# Altium footprint library con-molex.PCBLIB: 368 footprints (part 25 of 26)
Each footprint in its own frame and in the unit in brackets; x right, y up, seen from the top. Pads: shape width x height; smd on the part's side, far side on the other; paste and mask are expansions set on the pad; w line width, h text height; cw(c..) or ccw(c..) is an arc to the next point about the centre after c.
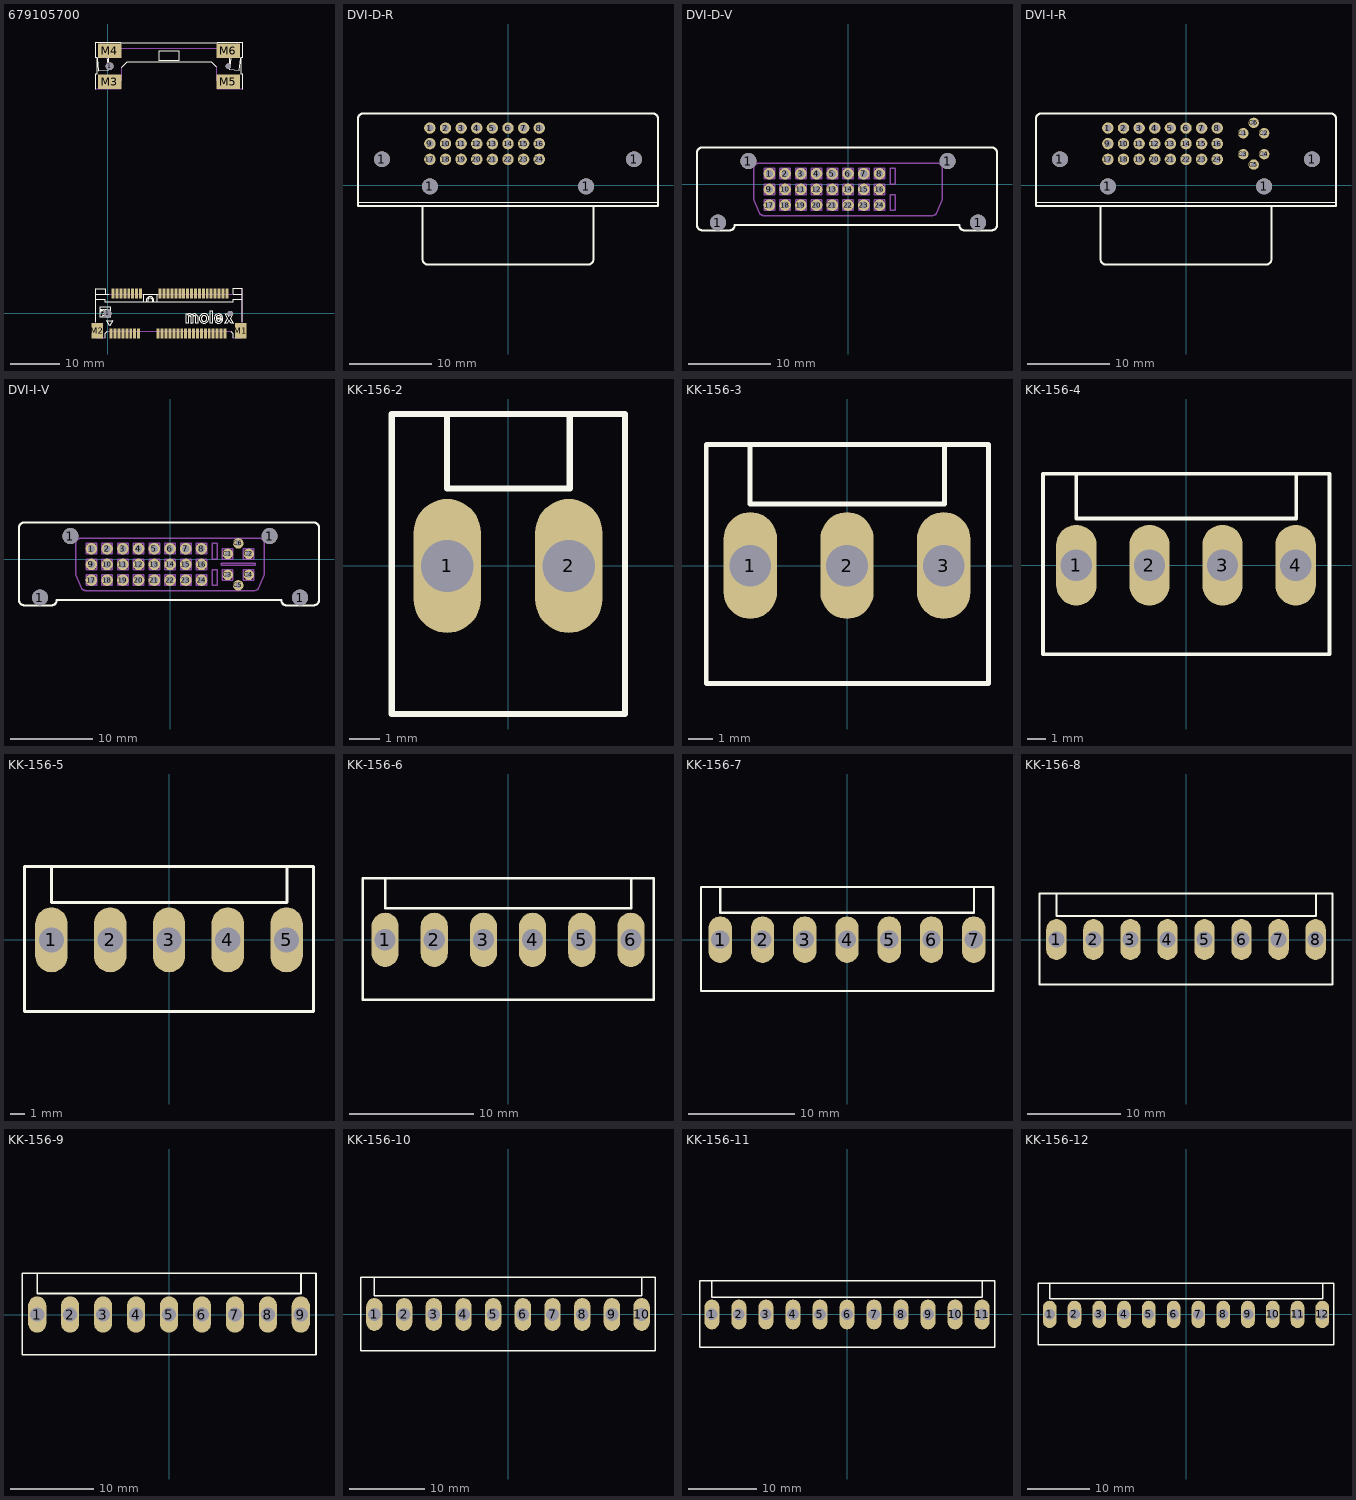
[diagram p24: the footprints below, top view; thin cyan lines are the x and y axes]

## 679105700 [mm]
pads (62):
  round 1.6 hole 1.6: 1(0,0) 1(0.4,50.4)
  rect 0.6x2 smd: 1(0.7,-4.1) 2(1.1,4.1) 3(1.5,-4.1) 4(1.9,4.1) 5(2.3,-4.1) 6(2.7,4.1) 7(3.1,-4.1) 8(3.5,4.1) 9(3.9,-4.1) 10(4.3,4.1) 11(4.7,-4.1) 12(5.1,4.1) 13(5.5,-4.1) 14(5.9,4.1) 15(6.3,-4.1) 16(6.7,4.1) 17(10.3,-4.1) 18(10.7,4.1) 19(11.1,-4.1) 20(11.5,4.1) 21(11.9,-4.1) 22(12.3,4.1) 23(12.7,-4.1) 24(13.1,4.1) 25(13.5,-4.1) 26(13.9,4.1) 27(14.3,-4.1) 28(14.7,4.1) 29(15.1,-4.1) 30(15.5,4.1) 31(15.9,-4.1) 32(16.3,4.1) 33(16.7,-4.1) 34(17.1,4.1) 35(17.5,-4.1) 36(17.9,4.1) 37(18.3,-4.1) 38(18.7,4.1) 39(19.1,-4.1) 40(19.5,4.1) 41(19.9,-4.1) 42(20.3,4.1) 43(20.7,-4.1) 44(21.1,4.1) 45(21.5,-4.1) 46(21.9,4.1) 47(22.3,-4.1) 48(22.7,4.1) 49(23.1,-4.1) 50(23.5,4.1) 51(23.9,-4.1) 52(24.3,4.1)
  round 1.1 hole 1.1: 1(24.6,50.4) 1(25,0)
  rect 2.3x3.2 smd: M1(27.15,-3.5) M2(-2.15,-3.5)
  rect 4.8x3 smd: M3(0.4,47.25) M4(0.4,53.55) M5(24.6,47.25) M6(24.6,53.55)
Top Overlay:
  drawing of 161 lines, arcs and shapes, not listed
Top Paste:
  rectangle: 0.437,-5.05 0.962,-3.15
  rectangle: 1.237,-5.05 1.763,-3.15
  rectangle: 2.038,-5.05 2.563,-3.15
  rectangle: 2.837,-5.05 3.362,-3.15
  rectangle: 3.638,-5.05 4.163,-3.15
  rectangle: 4.437,-5.05 4.962,-3.15
  rectangle: 5.237,-5.05 5.762,-3.15
  rectangle: 6.038,-5.05 6.563,-3.15
  rectangle: 10.038,-5.05 10.563,-3.15
  rectangle: 10.837,-5.05 11.362,-3.15
  rectangle: 11.638,-5.05 12.163,-3.15
  rectangle: 12.438,-5.05 12.962,-3.15
  rectangle: 13.237,-5.05 13.762,-3.15
  rectangle: 14.038,-5.05 14.563,-3.15
  rectangle: 14.837,-5.05 15.362,-3.15
  rectangle: 15.638,-5.05 16.163,-3.15
  rectangle: 16.438,-5.05 16.963,-3.15
  rectangle: 17.237,-5.05 17.762,-3.15
  rectangle: 18.038,-5.05 18.563,-3.15
  rectangle: 18.837,-5.05 19.362,-3.15
  rectangle: 19.638,-5.05 20.163,-3.15
  rectangle: 20.438,-5.05 20.963,-3.15
  rectangle: 21.237,-5.05 21.762,-3.15
  rectangle: 22.038,-5.05 22.563,-3.15
  rectangle: 22.837,-5.05 23.362,-3.15
  rectangle: 23.637,-5.05 24.163,-3.15
  rectangle: 26.1,-5 28.2,-2
  rectangle: -3.2,-4.988 -1.1,-1.988
  rectangle: 0.837,3.15 1.362,5.05
  rectangle: 1.638,3.15 2.163,5.05
  rectangle: 2.437,3.15 2.962,5.05
  rectangle: 3.237,3.15 3.763,5.05
  rectangle: 4.038,3.15 4.563,5.05
  rectangle: 4.837,3.15 5.362,5.05
  rectangle: 5.638,3.15 6.163,5.05
  rectangle: 6.437,3.15 6.962,5.05
  rectangle: 10.438,3.15 10.962,5.05
  rectangle: 11.237,3.15 11.762,5.05
  rectangle: 12.038,3.15 12.563,5.05
  rectangle: 12.837,3.15 13.362,5.05
  rectangle: 13.638,3.15 14.163,5.05
  rectangle: 14.438,3.15 14.962,5.05
  rectangle: 15.237,3.15 15.762,5.05
  rectangle: 16.038,3.15 16.563,5.05
  rectangle: 16.837,3.15 17.362,5.05
  rectangle: 17.638,3.15 18.163,5.05
  rectangle: 18.438,3.15 18.963,5.05
  rectangle: 19.237,3.15 19.762,5.05
  rectangle: 20.038,3.15 20.563,5.05
  rectangle: 20.837,3.15 21.362,5.05
  rectangle: 21.637,3.15 22.163,5.05
  rectangle: 22.438,3.15 22.963,5.05
  rectangle: 23.237,3.15 23.762,5.05
  rectangle: 24.038,3.15 24.563,5.05
  rectangle: -1.863,52.237 2.638,54.888
  rectangle: -1.863,45.925 2.638,48.575
  rectangle: 22.35,52.2 26.85,54.888
  rectangle: 22.338,45.937 26.837,48.587
Top Solder:
  rectangle: 0.35,-5.175 1.038,-3.025
  rectangle: 1.15,-5.175 1.837,-3.025
  rectangle: 1.95,-5.175 2.638,-3.025
  rectangle: 2.75,-5.175 3.437,-3.025
  rectangle: 3.55,-5.175 4.237,-3.025
  rectangle: 4.35,-5.175 5.038,-3.025
  rectangle: 5.15,-5.175 5.837,-3.025
  rectangle: 5.95,-5.175 6.638,-3.025
  rectangle: 9.95,-5.175 10.638,-3.025
  rectangle: 10.75,-5.175 11.438,-3.025
  rectangle: 11.55,-5.175 12.237,-3.025
  rectangle: 12.35,-5.175 13.038,-3.025
  rectangle: 13.15,-5.175 13.837,-3.025
  rectangle: 13.95,-5.175 14.638,-3.025
  rectangle: 14.75,-5.175 15.438,-3.025
  rectangle: 15.55,-5.175 16.237,-3.025
  rectangle: 16.35,-5.175 17.038,-3.025
  rectangle: 17.15,-5.175 17.837,-3.025
  rectangle: 17.95,-5.175 18.638,-3.025
  rectangle: 18.75,-5.175 19.438,-3.025
  rectangle: 19.55,-5.175 20.237,-3.025
  rectangle: 20.35,-5.175 21.038,-3.025
  rectangle: 21.15,-5.175 21.837,-3.025
  rectangle: 21.95,-5.175 22.637,-3.025
  rectangle: 22.75,-5.175 23.438,-3.025
  rectangle: 23.55,-5.175 24.237,-3.025
  rectangle: 25.9,-5.2 28.4,-1.813
  rectangle: -3.4,-5.187 -0.9,-1.8
  rectangle: 0.75,3.025 1.437,5.175
  rectangle: 1.55,3.025 2.237,5.175
  rectangle: 2.35,3.025 3.038,5.175
  rectangle: 3.15,3.025 3.837,5.175
  rectangle: 3.95,3.025 4.638,5.175
  rectangle: 4.75,3.025 5.437,5.175
  rectangle: 5.55,3.025 6.237,5.175
  rectangle: 6.35,3.025 7.038,5.175
  rectangle: 10.35,3.025 11.038,5.175
  rectangle: 11.15,3.025 11.837,5.175
  rectangle: 11.95,3.025 12.638,5.175
  rectangle: 12.75,3.025 13.438,5.175
  rectangle: 13.55,3.025 14.237,5.175
  rectangle: 14.35,3.025 15.038,5.175
  rectangle: 15.15,3.025 15.837,5.175
  rectangle: 15.95,3.025 16.638,5.175
  rectangle: 16.75,3.025 17.438,5.175
  rectangle: 17.55,3.025 18.237,5.175
  rectangle: 18.35,3.025 19.038,5.175
  rectangle: 19.15,3.025 19.837,5.175
  rectangle: 19.95,3.025 20.637,5.175
  rectangle: 20.75,3.025 21.438,5.175
  rectangle: 21.55,3.025 22.237,5.175
  rectangle: 22.35,3.025 23.038,5.175
  rectangle: 23.15,3.025 23.837,5.175
  rectangle: 23.95,3.025 24.637,5.175
  rectangle: -2.187,51.875 2.962,55.212
  rectangle: -2.187,45.563 2.962,48.9
  rectangle: 22.025,51.875 27.175,55.212
  rectangle: 22.012,45.575 27.163,48.913
Mechanical 16:
  rectangle: 0.948,3.929 1.274,4.77
  rectangle: 1.761,3.929 2.087,4.77
  rectangle: 2.547,3.929 2.872,4.77
  rectangle: 3.333,3.929 3.659,4.77
  rectangle: 10.54,3.929 10.865,4.77
  rectangle: 11.353,3.929 11.678,4.77
  rectangle: 12.139,3.929 12.464,4.77
  rectangle: 0.571,-4.553 0.842,-3.604
  rectangle: 1.357,-4.553 1.628,-3.605
  rectangle: 2.17,-4.553 2.441,-3.605
  rectangle: 10.163,-4.553 10.434,-3.605
  rectangle: 10.976,-4.553 11.247,-3.605
  rectangle: 11.788,-4.553 12.059,-3.605
  rectangle: 2.97,-4.553 3.241,-3.605
  rectangle: 3.77,-4.553 4.041,-3.605
  rectangle: 4.57,-4.553 4.841,-3.605
  rectangle: 5.37,-4.553 5.641,-3.605
  rectangle: 6.17,-4.553 6.441,-3.605
  rectangle: 12.563,-4.553 12.834,-3.605
  rectangle: 13.362,-4.553 13.633,-3.605
  rectangle: 14.163,-4.553 14.434,-3.605
  rectangle: 14.962,-4.553 15.233,-3.605
  rectangle: 15.762,-4.553 16.033,-3.605
  rectangle: 16.563,-4.553 16.834,-3.605
  rectangle: 17.362,-4.553 17.633,-3.605
  rectangle: 18.163,-4.553 18.434,-3.605
  rectangle: 18.963,-4.553 19.233,-3.605
  rectangle: 19.762,-4.553 20.033,-3.605
  rectangle: 20.563,-4.553 20.834,-3.605
  rectangle: 21.362,-4.553 21.633,-3.605
  rectangle: 22.163,-4.553 22.434,-3.605
  rectangle: 22.963,-4.553 23.233,-3.605
  rectangle: 23.762,-4.553 24.033,-3.605
  rectangle: 4.149,3.929 4.474,4.77
  rectangle: 4.948,3.929 5.274,4.77
  rectangle: 5.749,3.929 6.074,4.77
  rectangle: 6.549,3.929 6.874,4.77
  rectangle: 12.94,3.929 13.265,4.77
  rectangle: 13.74,3.929 14.065,4.77
  rectangle: 14.54,3.929 14.865,4.77
  rectangle: 15.34,3.929 15.665,4.77
  rectangle: 16.14,3.929 16.465,4.77
  rectangle: 16.94,3.929 17.265,4.77
  rectangle: 17.74,3.929 18.065,4.77
  rectangle: 18.54,3.929 18.865,4.77
  rectangle: 19.34,3.929 19.665,4.77
  rectangle: 20.14,3.929 20.465,4.77
  rectangle: 20.94,3.929 21.265,4.77
  rectangle: 21.74,3.929 22.065,4.77
  rectangle: 22.54,3.929 22.865,4.77
  rectangle: 23.34,3.929 23.665,4.77
  rectangle: 24.14,3.929 24.465,4.77
  lines w0.102: -2.439,5.068 -2.439,-4.905 -0.542,-4.905 ; -2.43,45.685 2.563,45.685 2.563,47.408 2.739,47.408 2.739,50.059 ; -2.385,3.929 27.371,3.929 ; -2.077,52.003 -0.044,52.18 0.177,49.706 0.177,53.992 ; -1.37,55.229 -1.37,54.389 ccw(c-1.016,54.389) -1.016,54.036 25.847,54.036 ccw(c25.847,54.566) 26.377,54.566 26.377,55.273 ; -0.081,-3.577 25.04,-3.577 ; 22.224,50.192 22.224,47.408 22.401,47.408 22.401,45.685 27.438,45.685 ; 24.787,53.992 24.787,49.794 25.096,52.18 27.084,52.003 ; 25.528,-4.932 27.425,-4.932 27.425,5.068

## DVI-D-R [mil]
pads (28):
  round 76 hole 76: 1(-605,125) 1(-375,-5) 1(375,-5) 1(605,125)
  round 55 hole 34: 1(-375,275) 2(-300,275) 3(-225,275) 4(-150,275) 5(-75,275) 6(0,275) 7(75,275) 8(150,275) 9(-375,200) 10(-300,200) 11(-225,200) 12(-150,200) 13(-75,200) 14(0,200) 15(75,200) 16(150,200) 17(-375,125) 18(-300,125) 19(-225,125) 20(-150,125) 21(-75,125) 22(0,125) 23(75,125) 24(150,125)
Top Overlay:
  lines w2: -720,-81 720,-81
  lines w10: -410,-105 -410,-355 ccw(c-385,-355) -385,-380 385,-380 ccw(c385,-355) 410,-355 410,-105 ; -720,-100 -720,-81 -720,320 cw(c-695,320) -695,345 695,345 cw(c695,320) 720,320 720,-81 720,-100 -720,-100

## DVI-D-V [mil]
pads (28):
  round 76 hole 76: 1(-620,-183) 1(-475,110) 1(475,110) 1(620,-183)
  round 55 hole 34: 1(-375,50) 2(-300,50) 3(-225,50) 4(-150,50) 5(-75,50) 6(0,50) 7(75,50) 8(150,50) 9(-375,-25) 10(-300,-25) 11(-225,-25) 12(-150,-25) 13(-75,-25) 14(0,-25) 15(75,-25) 16(150,-25) 17(-375,-100) 18(-300,-100) 19(-225,-100) 20(-150,-100) 21(-75,-100) 22(0,-100) 23(75,-100) 24(150,-100)
Top Overlay:
  lines w10: -720,-195 -720,150 cw(c-695,150) -695,175 685,175 cw(c685,150) 710,150 710,-195 cw(c685,-195) 685,-220 555,-220 cw(c555,-195) 530,-195 -540,-195 cw(c-565,-195) -565,-220 -695,-220 cw(c-695,-195) -720,-195
Mechanical 16:
  lines w6: -450,-75 -450,75 cw(c-425,75) -425,100 425,100 cw(c425,75) 450,75 450,-75 420,-140 cw(c400,-125) 400,-150 -400,-150 cw(c-400,-125) -420,-140 -450,-75 ; -400,-125 -400,-75 -350,-75 -350,-125 -400,-125 ; -400,-50 -400,0 -350,0 -350,-50 -400,-50 ; -400,25 -400,75 -350,75 -350,25 -400,25 ; -325,-125 -325,-75 -275,-75 -275,-125 -325,-125 ; -325,-50 -325,0 -275,0 -275,-50 -325,-50 ; -325,25 -325,75 -275,75 -275,25 -325,25 ; -250,-125 -250,-75 -200,-75 -200,-125 -250,-125 ; -250,-50 -250,0 -200,0 -200,-50 -250,-50 ; -250,25 -250,75 -200,75 -200,25 -250,25 ; -175,-125 -175,-75 -125,-75 -125,-125 -175,-125 ; -175,-50 -175,0 -125,0 -125,-50 -175,-50 ; -175,25 -175,75 -125,75 -125,25 -175,25 ; -100,-125 -100,-75 -50,-75 -50,-125 -100,-125 ; -100,-50 -100,0 -50,0 -50,-50 -100,-50 ; -100,25 -100,75 -50,75 -50,25 -100,25 ; -25,-125 -25,-75 25,-75 25,-125 -25,-125 ; -25,-50 -25,0 25,0 25,-50 -25,-50 ; -25,25 -25,75 25,75 25,25 -25,25 ; 50,-125 50,-75 100,-75 100,-125 50,-125 ; 50,-50 50,0 100,0 100,-50 50,-50 ; 50,25 50,75 100,75 100,25 50,25 ; 125,-125 125,-75 175,-75 175,-125 125,-125 ; 125,-50 125,0 175,0 175,-50 125,-50 ; 125,25 125,75 175,75 175,25 125,25 ; 200,-125 225,-125 225,-50 200,-50 200,-125 ; 200,0 225,0 225,75 200,75 200,0

## DVI-I-R [mil]
pads (34):
  round 76 hole 76: 1(-605,125) 1(-375,-5) 1(375,-5) 1(605,125)
  round 55 hole 34: 1(-375,275) 2(-300,275) 3(-225,275) 4(-150,275) 5(-75,275) 6(0,275) 7(75,275) 8(150,275) 9(-375,200) 10(-300,200) 11(-225,200) 12(-150,200) 13(-75,200) 14(0,200) 15(75,200) 16(150,200) 17(-375,125) 18(-300,125) 19(-225,125) 20(-150,125) 21(-75,125) 22(0,125) 23(75,125) 24(150,125)
  round 50 hole 26: C1(275,250) C2(375,250) C3(275,150) C4(375,150) C5(325,100) C6(325,300)
Top Overlay:
  lines w2: -720,-81 720,-81
  lines w10: -410,-105 -410,-355 ccw(c-385,-355) -385,-380 385,-380 ccw(c385,-355) 410,-355 410,-105 ; -720,-100 -720,-81 -720,320 cw(c-695,320) -695,345 695,345 cw(c695,320) 720,320 720,-81 720,-100 -720,-100

## DVI-I-V [mil]
pads (34):
  round 76 hole 76: 1(-620,-183) 1(-475,110) 1(475,110) 1(620,-183)
  round 55 hole 34: 1(-375,50) 2(-300,50) 3(-225,50) 4(-150,50) 5(-75,50) 6(0,50) 7(75,50) 8(150,50) 9(-375,-25) 10(-300,-25) 11(-225,-25) 12(-150,-25) 13(-75,-25) 14(0,-25) 15(75,-25) 16(150,-25) 17(-375,-100) 18(-300,-100) 19(-225,-100) 20(-150,-100) 21(-75,-100) 22(0,-100) 23(75,-100) 24(150,-100)
  round 50 hole 26: C1(275,25) C2(375,25) C3(275,-75) C4(375,-75) C5(325,-125) C6(325,75)
Top Overlay:
  lines w10: -720,-195 -720,150 cw(c-695,150) -695,175 685,175 cw(c685,150) 710,150 710,-195 cw(c685,-195) 685,-220 555,-220 cw(c555,-195) 530,-195 -540,-195 cw(c-565,-195) -565,-220 -695,-220 cw(c-695,-195) -720,-195
Mechanical 16:
  lines w6: -450,-75 -450,75 cw(c-425,75) -425,100 425,100 cw(c425,75) 450,75 450,-75 420,-140 cw(c400,-125) 400,-150 -400,-150 cw(c-400,-125) -420,-140 -450,-75 ; -400,-125 -400,-75 -350,-75 -350,-125 -400,-125 ; -400,-50 -400,0 -350,0 -350,-50 -400,-50 ; -400,25 -400,75 -350,75 -350,25 -400,25 ; -325,-125 -325,-75 -275,-75 -275,-125 -325,-125 ; -325,-50 -325,0 -275,0 -275,-50 -325,-50 ; -325,25 -325,75 -275,75 -275,25 -325,25 ; -250,-125 -250,-75 -200,-75 -200,-125 -250,-125 ; -250,-50 -250,0 -200,0 -200,-50 -250,-50 ; -250,25 -250,75 -200,75 -200,25 -250,25 ; -175,-125 -175,-75 -125,-75 -125,-125 -175,-125 ; -175,-50 -175,0 -125,0 -125,-50 -175,-50 ; -175,25 -175,75 -125,75 -125,25 -175,25 ; -100,-125 -100,-75 -50,-75 -50,-125 -100,-125 ; -100,-50 -100,0 -50,0 -50,-50 -100,-50 ; -100,25 -100,75 -50,75 -50,25 -100,25 ; -25,-125 -25,-75 25,-75 25,-125 -25,-125 ; -25,-50 -25,0 25,0 25,-50 -25,-50 ; -25,25 -25,75 25,75 25,25 -25,25 ; 50,-125 50,-75 100,-75 100,-125 50,-125 ; 50,-50 50,0 100,0 100,-50 50,-50 ; 50,25 50,75 100,75 100,25 50,25 ; 125,-125 125,-75 175,-75 175,-125 125,-125 ; 125,-50 125,0 175,0 175,-50 125,-50 ; 125,25 125,75 175,75 175,25 125,25 ; 200,-125 225,-125 225,-50 200,-50 200,-125 ; 200,0 225,0 225,75 200,75 200,0 ; 245,-30 405,-30 405,-20 245,-20 245,-30 ; 250,-100 250,-50 300,-50 300,-100 250,-100 ; 250,0 250,50 300,50 300,0 250,0 ; 350,-100 350,-50 400,-50 400,-100 350,-100 ; 350,0 350,50 400,50 400,0 350,0

## KK-156-2 [mil]
pads (2):
  oval 86x172 hole 66.93: 1(-77.95,0) 2(77.95,0)
Top Overlay:
  lines w8: -78.15,194.88 79.13,194.88 ; -78.15,194.88 -149.02,194.88 -149.02,-189.96 150,-189.96 150,194.88 79.13,194.88 ; -78.15,194.88 -78.15,99.41 79.13,99.41 79.13,194.88

## KK-156-3 [mil]
pads (3):
  oval 86x172 hole 66.93: 1(-155.91,0) 2(0,0) 3(155.91,0)
Top Overlay:
  lines w8: -156.1,194.88 157.09,194.88 ; -156.1,194.88 -226.97,194.88 -226.97,-189.96 227.95,-189.96 227.95,194.88 157.09,194.88 ; -156.1,194.88 -156.1,99.41 157.09,99.41 157.09,194.88

## KK-156-4 [mil]
pads (4):
  oval 86x172 hole 66.93: 1(-233.86,0) 2(-77.95,0) 3(77.95,0) 4(233.86,0)
Top Overlay:
  lines w8: -234.06,194.88 235.04,194.88 ; -234.06,194.88 -304.92,194.88 -304.92,-189.96 305.91,-189.96 305.91,194.88 235.04,194.88 ; -234.06,194.88 -234.06,99.41 235.04,99.41 235.04,194.88

## KK-156-5 [mil]
pads (5):
  oval 86x172 hole 66.93: 1(-311.81,0) 2(-155.91,0) 3(0,0) 4(155.91,0) 5(311.81,0)
Top Overlay:
  lines w8: -312.01,194.88 312.99,194.88 ; -312.01,194.88 -382.87,194.88 -382.87,-189.96 383.86,-189.96 383.86,194.88 312.99,194.88 ; -312.01,194.88 -312.01,99.41 312.99,99.41 312.99,194.88

## KK-156-6 [mil]
pads (6):
  oval 86x172 hole 66.93: 1(-389.76,0) 2(-233.86,0) 3(-77.95,0) 4(77.95,0) 5(233.86,0) 6(389.76,0)
Top Overlay:
  lines w8: -389.96,194.88 390.94,194.88 ; -389.96,194.88 -460.83,194.88 -460.83,-189.96 461.81,-189.96 461.81,194.88 390.94,194.88 ; -389.96,194.88 -389.96,99.41 390.94,99.41 390.94,194.88

## KK-156-7 [mil]
pads (7):
  oval 86x172 hole 66.93: 1(-467.72,0) 2(-311.81,0) 3(-155.91,0) 4(0,0) 5(155.91,0) 6(311.81,0) 7(467.72,0)
Top Overlay:
  lines w8: -467.91,194.88 468.9,194.88 ; -467.91,194.88 -538.78,194.88 -538.78,-189.96 539.76,-189.96 539.76,194.88 468.9,194.88 ; -467.91,194.88 -467.91,99.41 468.9,99.41 468.9,194.88

## KK-156-8 [mil]
pads (8):
  oval 86x172 hole 66.93: 1(-545.67,0) 2(-389.76,0) 3(-233.86,0) 4(-77.95,0) 5(77.95,0) 6(233.86,0) 7(389.76,0) 8(545.67,0)
Top Overlay:
  lines w8: -545.87,194.88 546.85,194.88 ; -545.87,194.88 -616.73,194.88 -616.73,-189.96 617.72,-189.96 617.72,194.88 546.85,194.88 ; -545.87,194.88 -545.87,99.41 546.85,99.41 546.85,194.88

## KK-156-9 [mil]
pads (9):
  oval 86x172 hole 66.93: 1(-623.62,0) 2(-467.72,0) 3(-311.81,0) 4(-155.91,0) 5(0,0) 6(155.91,0) 7(311.81,0) 8(467.72,0) 9(623.62,0)
Top Overlay:
  lines w8: -623.82,194.88 624.8,194.88 ; -623.82,194.88 -694.69,194.88 -694.69,-189.96 695.67,-189.96 695.67,194.88 624.8,194.88 ; -623.82,194.88 -623.82,99.41 624.8,99.41 624.8,194.88

## KK-156-10 [mil]
pads (10):
  oval 86x172 hole 66.93: 1(-701.57,0) 2(-545.67,0) 3(-389.76,0) 4(-233.86,0) 5(-77.95,0) 6(77.95,0) 7(233.86,0) 8(389.76,0) 9(545.67,0) 10(701.57,0)
Top Overlay:
  lines w8: -701.77,194.88 702.76,194.88 ; -701.77,194.88 -772.64,194.88 -772.64,-189.96 773.62,-189.96 773.62,194.88 702.76,194.88 ; -701.77,194.88 -701.77,99.41 702.76,99.41 702.76,194.88

## KK-156-11 [mil]
pads (11):
  oval 86x172 hole 66.93: 1(-779.53,0) 2(-623.62,0) 3(-467.72,0) 4(-311.81,0) 5(-155.91,0) 6(0,0) 7(155.91,0) 8(311.81,0) 9(467.72,0) 10(623.62,0) 11(779.53,0)
Top Overlay:
  lines w8: -779.72,194.88 780.71,194.88 ; -779.72,194.88 -850.59,194.88 -850.59,-189.96 851.57,-189.96 851.57,194.88 780.71,194.88 ; -779.72,194.88 -779.72,99.41 780.71,99.41 780.71,194.88

## KK-156-12 [mil]
pads (12):
  oval 86x172 hole 66.93: 1(-857.48,0) 2(-701.57,0) 3(-545.67,0) 4(-389.76,0) 5(-233.86,0) 6(-77.95,0) 7(77.95,0) 8(233.86,0) 9(389.76,0) 10(545.67,0) 11(701.57,0) 12(857.48,0)
Top Overlay:
  lines w8: -857.68,194.88 858.66,194.88 ; -857.68,194.88 -928.54,194.88 -928.54,-189.96 929.53,-189.96 929.53,194.88 858.66,194.88 ; -857.68,194.88 -857.68,99.41 858.66,99.41 858.66,194.88